# Altium footprint library Altium_Lib.PcbLib: 334 footprints (part 14 of 21)
Each footprint in its own frame and in the unit in brackets; x right, y up, seen from the top. Pads: shape width x height; smd on the part's side, far side on the other; paste and mask are expansions set on the pad; w line width, h text height; cw(c..) or ccw(c..) is an arc to the next point about the centre after c.
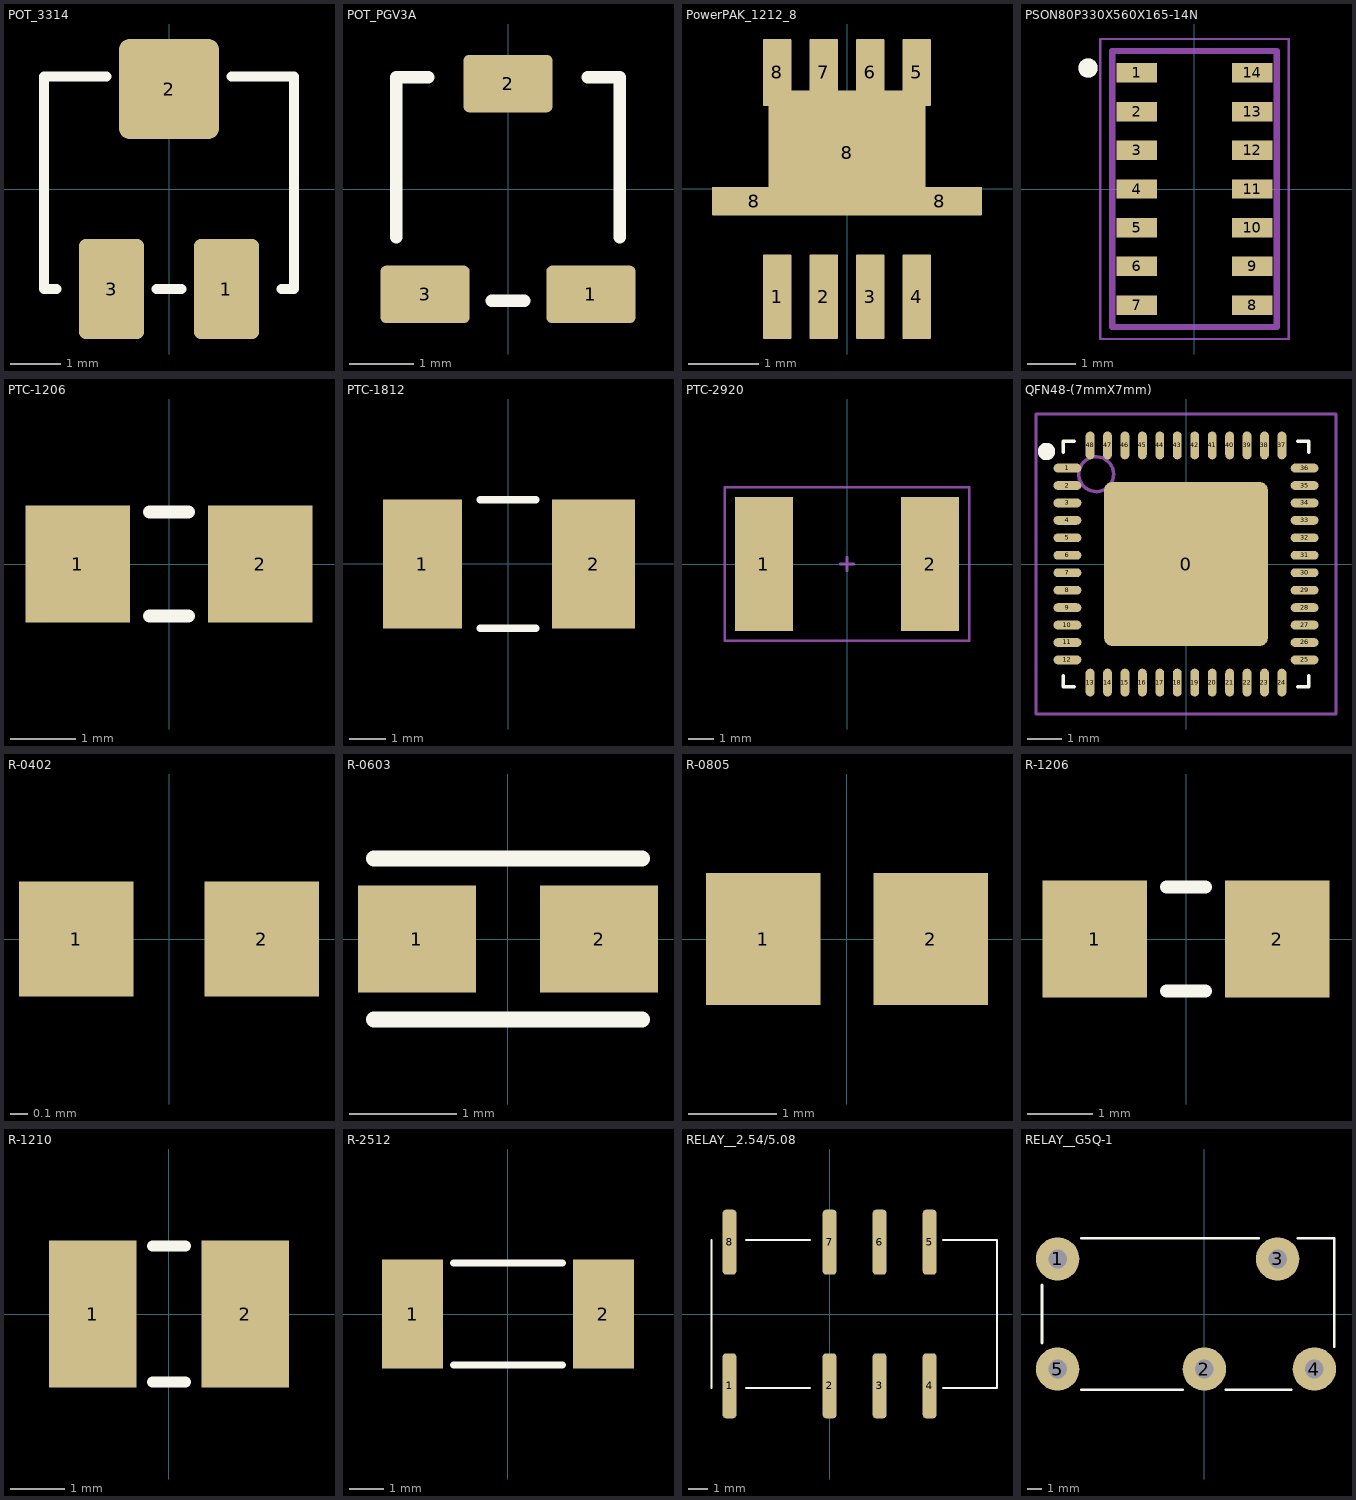
[diagram p13: the footprints below, top view; thin cyan lines are the x and y axes]

## POT_3314 [mm]
pads (3):
  rrect20% 1.3x2 smd: 1(1.15,-2) 3(-1.15,-2)
  rrect20% 2x2 smd: 2(0,2)
Top Overlay:
  lines w0.2: -2.25,-2 -2.5,-2 -2.5,2.25 -1.25,2.25 ; -0.25,-2 0.25,-2 ; 1.25,2.25 2.5,2.25 2.5,-2 2.25,-2
3D body "3314J1.stp": height 2.75, standoff 0.03, extent -2.5,-2.349 2.499,2.654

## POT_PGV3A [mm]
pads (3):
  rrect20% 1.4x0.9 smd: 1(1.3,-1.65) 2(0,1.65) 3(-1.3,-1.65)
Top Overlay:
  lines w0.2: -1.75,-0.75 -1.75,1.75 -1.25,1.75 ; -0.25,-1.75 0.25,-1.75 ; 1.25,1.75 1.75,1.75 1.75,-0.75
3D body "SW3dPS-TRIMMER_PVG3A.STEP": height 2, standoff 0, extent -1.7,-1.75 1.7,1.85

## PowerPAK_1212_8 [mm]
pads (11):
  rrect5% 0.4x1.2 smd mask+0: 1(-0.991,-1.535) 2(-0.33,-1.535) 3(0.33,-1.535) 4(0.991,-1.535)
  rrect5% 0.4x0.95 smd mask+0: 5(0.991,1.651) 6(0.33,1.651) 7(-0.33,1.651) 8(-0.991,1.651)
  rrect5% 1.2x0.4 smd mask+0: 8(-1.321,-0.178) 8(1.321,-0.178)
  rrect5% 2.235x1.778 smd mask+0: 8(0,0.508)
3D body "PowerPAK_1212_8.step": height 1.04, standoff 0, extent -1.65,-1.65 1.65,1.65
3D body: height 1.04, standoff 1, extent -1.1,-1 1.1,-0.2

## PSON80P330X560X165-14N [mm]
pads (14):
  rect 0.84x0.4 smd: 1(-1.195,2.4) 2(-1.195,1.6) 3(-1.195,0.8) 4(-1.195,0) 5(-1.195,-0.8) 6(-1.195,-1.6) 7(-1.195,-2.4) 8(1.195,-2.4) 9(1.195,-1.6) 10(1.195,-0.8) 11(1.195,0) 12(1.195,0.8) 13(1.195,1.6) 14(1.195,2.4)
Top Overlay:
  circle w0.2: c-2.2,2.5 r0.1
Mechanical 13:
  circle w0.2: c-2.2,2.5 r0.1
  lines w0.127: -1.7,-2.85 1.7,-2.85 1.7,2.85 -1.7,2.85 -1.7,-2.85
Mechanical 15:
  lines w0.05: -1.95,-3.1 1.95,-3.1 1.95,3.1 -1.95,3.1 -1.95,-3.1
3D body "MAX30102EFD---3DModel-STEP-418109.STEP": height 1.65, standoff 0, extent -1.653,-2.813 1.647,2.787

## PTC-1206 [mm]
pads (2):
  rect 1.6x1.8 smd: 1(-1.4,0) 2(1.4,0)
Top Overlay:
  lines w0.2: -0.3,-0.8 0.3,-0.8 ; -0.3,0.8 0.3,0.8
3D body "nona SMD075F.STEP": height 0.56, standoff 0, extent -1.601,-0.826 1.601,0.826

## PTC-1812 [mm] "Chip Resistor; Body 2.0 x 1.3 mm (LxW typ)"
height 0.65
pads (2):
  rect 2.15x3.5 smd: 1(-2.325,0)
  rect 2.25x3.5 smd: 2(2.325,0)
Top Overlay:
  lines w0.2: -0.75,-1.75 0.75,-1.75 ; -0.75,1.75 0.75,1.75
3D body "PolyFuse_1812_Black.step": height 1.32, standoff 0, extent -2.41,-1.61 2.41,1.61

## PTC-2920 [mm] "Chip Resistor; Body 2.0 x 1.3 mm (LxW typ)"
height 0.65
pads (2):
  rect 2.3x5.3 smd: 1(-3.3,0) 2(3.3,0)
Mechanical 15:
  lines w0.1: -0.275,0 0.275,0 ; 0,-0.275 0,0.275 ; -4.85,-3.05 4.85,-3.05 4.85,3.05 -4.85,3.05 -4.85,-3.05
3D body "PolyFuse_2920.step": height 0.99, standoff -0.01, extent -3.85,-2.65 3.85,2.65

## QFN48-(7mmX7mm) [mm] "QFN, 48-Leads, Body 7,1x7,1mm (max), Pitch 0,50mm, IPC Medium Density"
height 0.9
pads (49):
  rrect10% 4.7x4.7 smd mask+0.076: 0(0,0)
  oval 0.8x0.25 smd mask+0.076: 1(-3.4,2.75) 2(-3.4,2.25) 3(-3.4,1.75) 4(-3.4,1.25) 5(-3.4,0.75) 6(-3.4,0.25) 7(-3.4,-0.25) 8(-3.4,-0.75) 9(-3.4,-1.25) 10(-3.4,-1.75) 11(-3.4,-2.25) 12(-3.4,-2.75) 25(3.4,-2.75) 26(3.4,-2.25) 27(3.4,-1.75) 28(3.4,-1.25) 29(3.4,-0.75) 30(3.4,-0.25) 31(3.4,0.25) 32(3.4,0.75) 33(3.4,1.25) 34(3.4,1.75) 35(3.4,2.25) 36(3.4,2.75)
  oval 0.25x0.8 smd mask+0.076: 13(-2.75,-3.4) 14(-2.25,-3.4) 15(-1.75,-3.4) 16(-1.25,-3.4) 17(-0.75,-3.4) 18(-0.25,-3.4) 19(0.25,-3.4) 20(0.75,-3.4) 21(1.25,-3.4) 22(1.75,-3.4) 23(2.25,-3.4) 24(2.75,-3.4) 37(2.75,3.4) 38(2.25,3.4) 39(1.75,3.4) 40(1.25,3.4) 41(0.75,3.4) 42(0.25,3.4) 43(-0.25,3.4) 44(-0.75,3.4) 45(-1.25,3.4) 46(-1.75,3.4) 47(-2.25,3.4) 48(-2.75,3.4)
Top Overlay:
  circle w0.25: c-4,3.225 r0.125
  lines w0.102: -3.525,-3.2 -3.525,-3.525 -3.2,-3.525 ; -3.525,3.2 -3.525,3.525 -3.2,3.525 ; 3.2,-3.525 3.525,-3.525 3.525,-3.2 ; 3.2,3.525 3.525,3.525 3.525,3.2
Mechanical 13:
  circle w0.1: c-2.575,2.575 r0.5
Mechanical 15:
  lines w0.1: -0.5,0 0.5,0 ; 0,-0.5 0,0.5 ; -4.3,-4.3 4.3,-4.3 4.3,4.3 -4.3,4.3 -4.3,-4.3
3D body "QFN_48_7x7_05p.step": height 0.78, standoff -0.02, extent -3.51,-3.51 3.51,3.51

## R-0402 [mm] "Chip Resistor, 2-Leads, Body 1.0x0.5mm, IPC Medium Density"
height 0.4
pads (2):
  rect 0.65x0.65 smd: 1(-0.525,0) 2(0.525,0)
3D body "0402_R.step": height 0.35, standoff 0, extent -0.5,-0.25 0.5,0.25

## R-0603 [mm] "Chip Resistor; Body 1.6 x 0.8 mm (LxW typ)"
height 0.85
pads (2):
  rect 1.1x1 smd: 1(-0.85,0) 2(0.85,0)
Top Overlay:
  lines w0.15: -1.25,-0.75 1.25,-0.75 ; -1.25,0.75 1.25,0.75
3D body "0603_R.step": height 0.45, standoff 0, extent -0.8,-0.4 0.8,0.4

## R-0805 [mm] "Chip Resistor; Body 2.0 x 1.3 mm (LxW typ)"
height 0.65
pads (2):
  rect 1.3x1.5 smd: 1(-0.95,0) 2(0.95,0)
3D body "0805_R.STEP": height 0.6, standoff 0, extent -1,-0.625 1,0.625

## R-1206 [mm] "Chip Resistor; Body 3.2 x 1.6 mm (LxW typ)"
height 1
pads (2):
  rect 1.6x1.8 smd: 1(-1.4,0) 2(1.4,0)
Top Overlay:
  lines w0.2: -0.3,-0.8 0.3,-0.8 ; -0.3,0.8 0.3,0.8
3D body "1206_R.STEP": height 0.6, standoff 0, extent -1.6,-0.8 1.6,0.8

## R-1210 [mm] "Chip Resistor; Body 3.2 x 2.5 mm (LxW typ)"
height 1
pads (2):
  rect 1.6x2.7 smd: 1(-1.4,0) 2(1.4,0)
Top Overlay:
  lines w0.2: -0.3,-1.25 0.3,-1.25 ; -0.3,1.25 0.3,1.25
3D body "1210_R.STEP": height 0.61, standoff 0, extent -1.7,-1.36 1.7,1.36

## R-2512 [mm] "Chip Resistor; Body 6.3 x 3.2 mm (LxW typ)"
height 0.7
pads (2):
  rect 1.8x3.2 smd: 1(-2.8,0) 2(2.8,0)
Top Overlay:
  lines w0.2: -1.6,-1.5 1.6,-1.5 ; -1.6,1.5 1.6,1.5
3D body "2512_R.STEP": height 0.71, standoff 0, extent -3.25,-1.66 3.25,1.66

## RELAY__2.54/5.08 [mm]
pads (8):
  rrect50% 0.7x3.3 smd: 1(-5.08,-3.645) 2(0,-3.645) 3(2.54,-3.645) 4(5.08,-3.645) 5(5.08,3.645) 6(2.54,3.645) 7(0,3.645) 8(-5.08,3.645)
Top Overlay:
  lines w0.1: -6,-3.75 -6,3.75 ; -4.25,-3.75 -1,-3.75 ; -4.25,3.75 -1,3.75 ; 5.75,-3.75 8.5,-3.75 8.5,3.75 5.75,3.75
3D body "1629014_v23079d2001b301.stp": height 9.95, standoff 0.05, extent -6.05,-4.7 8.55,4.7

## RELAY__G5Q-1 [mm]
pads (5):
  round 3 hole 1.3 mask+0.05: 1(-10.16,3.81) 2(0,-3.81) 3(5.08,3.81) 4(7.62,-3.81) 5(-10.16,-3.81)
Top Overlay:
  lines w0.2: -11.25,-2 -11.25,2 ; -8.5,-5.25 -1.5,-5.25 ; -8.5,5.25 3.75,5.25 ; 1.5,-5.25 6,-5.25 ; 6.5,5.25 9,5.25 9,-2.25
3D body "g5q-1_12dc.stp": height 16.4, standoff -3.2, extent -11.3,-5.15 9,5.15